# Altium footprint library con-amp.PCBLIB: 295 footprints (part 4 of 19)
Each footprint in its own frame and in the unit in brackets; x right, y up, seen from the top. Pads: shape width x height; smd on the part's side, far side on the other; paste and mask are expansions set on the pad; w line width, h text height; cw(c..) or ccw(c..) is an arc to the next point about the centre after c.
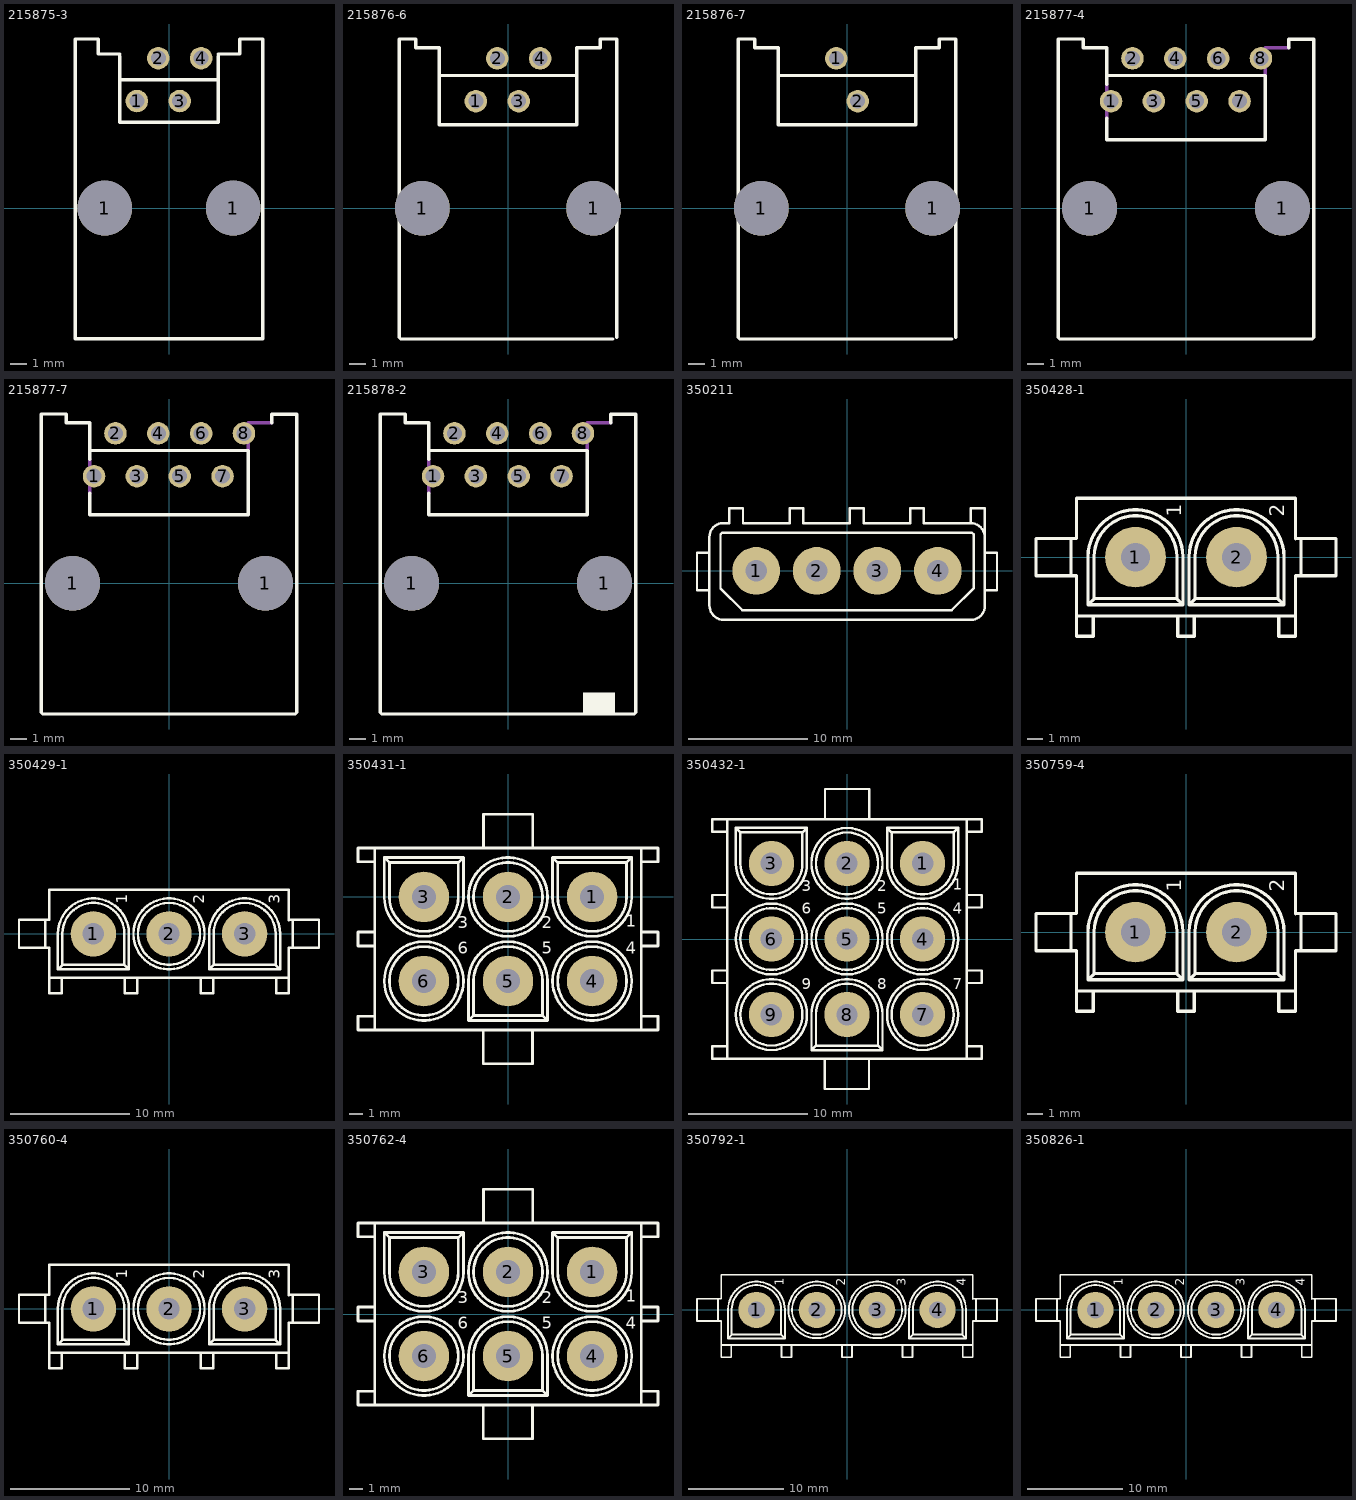
[diagram p3: the footprints below, top view; thin cyan lines are the x and y axes]

## 215875-3 [mil]
pads (6):
  round 128 hole 128: 1(-150,0) 1(150,0)
  round 52.5 hole 35: 1(-75,250) 2(-25,350) 3(25,250) 4(75,350)
Top Overlay:
  lines w8: -218.35,-305.51 -218.35,394.8 -165,394.8 -165,360 -115,359.8 ; -215,-305 215,-305 ; -115,355 -115,300 ; 115,355 115,300 ; 115,359.8 165,360 165,394.8 218.35,394.8 218.35,-305.51 ; -115,300 -115,200 115,200 115,300 ; -115,300 115,300

## 215876-6 [mil]
pads (6):
  round 128 hole 128: 1(-200,0) 1(200,0)
  round 52.5 hole 35: 1(-75,250) 2(-25,350) 3(25,250) 4(75,350)
Top Overlay:
  lines w8: -253.35,-300.51 -253.35,394.8 ; -253.35,395.2 -215,395.2 -215,375 -160,375.2 ; -250,-305 245,-305 ; -160,375 -160,310 ; 160,375 160,310 ; 160,375.2 215,375 215,395.2 253.35,395.2 ; 253.35,-300.51 253.35,394.8 ; -160,310 160,310 ; -160,310 -160,195 160,195 160,310

## 215876-7 [mil]
pads (4):
  round 128 hole 128: 1(-200,0) 1(200,0)
  round 52.5 hole 35: 1(-25,350) 2(25,250)
Top Overlay:
  lines w8: -253.35,-300.51 -253.35,394.8 ; -253.35,395.2 -215,395.2 -215,375 -160,375.2 ; -250,-305 245,-305 ; -160,375 -160,310 ; 160,375 160,310 ; 160,375.2 215,375 215,395.2 253.35,395.2 ; 253.35,-300.51 253.35,394.8 ; -160,310 160,310 ; -160,310 -160,195 160,195 160,310

## 215877-4 [mil]
pads (10):
  round 128 hole 128: 1(-225,0) 1(225,0)
  round 52.5 hole 35: 1(-175,250) 2(-125,350) 3(-75,250) 4(-25,350) 5(25,250) 6(75,350) 7(125,250) 8(175,350)
Top Overlay:
  lines w8: -298.35,-300.51 -298.35,394.8 ; -298.35,395.2 -240,395.2 -240,375 -185,375.2 ; -295,-305 295,-305 ; -185,210 -185,160 185,160 185,310 -185,310 ; -185,290 -185,310 ; -185,375 -185,310 ; 240,375 240,394.8 ; 240,395.2 240,394.8 ; 298.35,-300.51 298.35,394.8 240,394.8
Mechanical 16:
  lines w8: -185,210 -185,290 ; 185,310 185,374.8 240,375

## 215877-7 [mil]
pads (10):
  round 128 hole 128: 1(-225,0) 1(225,0)
  round 52.5 hole 35: 1(-175,250) 2(-125,350) 3(-75,250) 4(-25,350) 5(25,250) 6(75,350) 7(125,250) 8(175,350)
Top Overlay:
  lines w8: -298.35,-300.51 -298.35,394.8 ; -298.35,395.2 -240,395.2 -240,375 -185,375.2 ; -295,-305 295,-305 ; -185,210 -185,160 185,160 185,310 -185,310 ; -185,290 -185,310 ; -185,375 -185,310 ; 240,375 240,394.8 ; 240,395.2 240,394.8 ; 298.35,-300.51 298.35,394.8 240,394.8
Mechanical 16:
  lines w8: -185,210 -185,290 ; 185,310 185,374.8 240,375

## 215878-2 [mil]
pads (10):
  round 128 hole 128: 1(-225,0) 1(225,0)
  round 52.5 hole 35: 1(-175,250) 2(-125,350) 3(-75,250) 4(-25,350) 5(25,250) 6(75,350) 7(125,250) 8(175,350)
Top Overlay:
  rectangle: 175,-305 250,-255
  lines w8: -298.35,-300.51 -298.35,394.8 ; -298.35,395.2 -240,395.2 -240,375 -185,375.2 ; -295,-305 295,-305 ; -185,210 -185,160 185,160 185,310 -185,310 ; -185,290 -185,310 ; -185,375 -185,310 ; 240,375 240,394.8 ; 240,395.2 240,394.8 ; 298.35,-300.51 298.35,394.8 240,394.8
Mechanical 16:
  lines w8: -185,210 -185,290 ; 185,310 185,374.8 240,375

## 350211 [mm]
pads (4):
  round 4 hole 1.8: 1(-7.62,0) 2(-2.54,0) 3(2.54,0) 4(7.62,0)
Top Overlay:
  lines w0.203: 11.578,2.841 11.578,5.25 ; 11.578,5.255 10.374,5.255 10.374,3.996 ; -11.551,-1.642 -11.551,1.533 ; -11.551,-1.642 -11.551,-2.901 ccw(c-10.346,-2.901) -10.346,-4.106 10.401,-4.106 ccw(c10.401,-2.929) 11.578,-2.929 11.578,-1.642 ; -11.551,-1.642 -12.591,-1.642 -12.591,1.533 -11.551,1.533 ; -11.551,1.533 -11.551,2.847 cw(c-10.401,2.847) -10.401,3.996 -9.881,3.996 -9.881,5.255 -8.732,5.255 -8.732,3.996 -4.817,3.996 -4.817,5.255 -3.668,5.255 -3.668,3.996 0.246,3.996 0.246,5.255 1.396,5.255 1.396,3.996 5.31,3.996 5.31,5.255 6.459,5.255 6.459,3.996 10.374,3.996 ; 10.374,3.996 cw(c10.374,2.792) 11.578,2.792 11.578,1.533 ; 11.578,-1.642 12.591,-1.642 12.591,1.533 11.578,1.533 ; 11.578,-1.642 11.578,1.533 ; -10.62,-1.478 -8.786,-3.312 8.786,-3.312 10.647,-1.451 10.647,3.038 10.483,3.202 -10.483,3.202 -10.62,3.066 -10.62,-1.478
Mechanical 16:
  circle w0.203: c7.62,0 r1.651
  circle w0.203: c2.54,0 r1.651
  circle w0.203: c-2.54,0 r1.651
  circle w0.203: c-7.62,0 r1.651

## 350428-1 [mil]
pads (2):
  round 150 hole 70.87: 1(-125,0) 2(125,0)
Top Overlay:
  lines w8: -285.43,-46.26 -371.06,-46.26 -371.06,46.26 -285.43,46.26 ; -270.67,-146.65 -270.67,-195.87 -229.33,-195.87 -229.33,-149.61 ; -242.49,0 -242.49,-117.5 ; -242.5,2.5 cw(c-125,-0.21) -7.51,2.5 -7.51,0 ; -227.49,0 -227.49,-102.5 ; -227.5,2.5 cw(c-125,-0.1) -22.51,2.5 -22.51,0 -22.49,-102.5 ; -20.67,-148.62 -20.67,-195.87 20.67,-195.87 20.67,-148.62 ; 227.5,0 227.5,-102.5 ; 227.49,2.5 ccw(c124.99,-0.17) 22.49,2.5 22.49,0 22.51,-102.5 ; 229.33,-150.59 229.33,-195.87 270.67,-195.87 270.67,-147.64 ; 242.5,0 242.5,-117.5 ; 242.49,2.5 ccw(c124.99,-0.21) 7.49,2.5 7.49,0 7.51,-117.5 ; 270.67,45.28 270.67,46.26 ; 285.43,-46.26 371.06,-46.26 371.06,46.26 285.43,46.26 ; -242.49,-117.5 -227.49,-102.5 ; -242.49,-117.5 -7.49,-117.5 ; -227.49,-102.5 -22.49,-102.5 ; -22.49,-102.5 -7.49,-117.5 ; -7.49,-117.5 -7.49,0 ; -7.49,0 -7.51,0 ; 7.51,-117.5 242.5,-117.5 ; 7.51,-117.5 22.51,-102.5 ; 22.51,-102.5 227.5,-102.5 ; 227.5,-102.5 242.5,-117.5 ; 270.67,46.26 270.67,145.67 -270.67,145.67 -270.67,46.26 -284.45,46.26 -284.45,-46.26 -270.67,-46.26 -270.67,-145.67 270.67,-145.67 270.67,-46.26 284.45,-46.26 284.45,46.26 270.67,46.26
  text "1" at 0,100 h62
  text "2" at 255,100 h62
Mechanical 16:
  circle w8: c125,0 r62.5
  circle w8: c-125,0 r62.51

## 350429-1 [mil]
pads (3):
  round 150 hole 70.87: 1(-250,0) 2(0,0) 3(250,0)
Top Overlay:
  lines w8: -410.43,-46.26 -496.06,-46.26 -496.06,46.26 -410.43,46.26 ; -395.67,-146.65 -395.67,-195.87 -354.33,-195.87 -354.33,-149.61 ; -367.49,0 -367.49,-117.5 ; -367.5,2.5 cw(c-250,-0.21) -132.51,2.5 -132.51,0 ; -352.49,0 -352.49,-102.5 ; -352.5,2.5 cw(c-250,-0.1) -147.51,2.5 -147.51,0 -147.49,-102.5 ; -145.67,-148.62 -145.67,-195.87 -104.33,-195.87 -104.33,-148.62 ; -117.49,-2.5 ccw(c0.01,0.21) 117.51,-2.5 ; -117.51,2.5 cw(c-0.01,-0.21) 117.49,2.5 ; -102.49,-2.5 ccw(c0.01,0.17) 102.51,-2.5 ; -102.51,2.5 cw(c-0.01,-0.17) 102.49,2.5 ; 104.33,-148.62 104.33,-195.87 145.67,-195.87 145.67,-148.62 ; 352.5,0 352.5,-102.5 ; 352.49,2.5 ccw(c249.99,-0.17) 147.49,2.5 147.49,0 147.51,-102.5 ; 354.33,-150.59 354.33,-195.87 395.67,-195.87 395.67,-147.64 ; 367.5,0 367.5,-117.5 ; 367.49,2.5 ccw(c249.99,-0.21) 132.49,2.5 132.49,0 132.51,-117.5 ; 395.67,45.28 395.67,46.26 ; 410.43,-46.26 496.06,-46.26 496.06,46.26 410.43,46.26 ; -367.49,-117.5 -352.49,-102.5 ; -367.49,-117.5 -132.49,-117.5 ; -352.49,-102.5 -147.49,-102.5 ; -147.49,-102.5 -132.49,-117.5 ; -132.49,-117.5 -132.49,0 ; -132.49,0 -132.51,0 ; 132.51,-117.5 367.5,-117.5 ; 132.51,-117.5 147.51,-102.5 ; 147.51,-102.5 352.5,-102.5 ; 352.5,-102.5 367.5,-117.5 ; 395.67,46.26 395.67,145.67 -395.67,145.67 -395.67,46.26 -409.45,46.26 -409.45,-46.26 -395.67,-46.26 -395.67,-145.67 395.67,-145.67 395.67,-46.26 409.45,-46.26 409.45,46.26 395.67,46.26
  text "1" at -125,100 h62
  text "2" at 130,100 h62
  text "3" at 380,100 h62
Mechanical 16:
  circle w8: c250,0 r62.5
  circle w8: c-250,0 r62.51
  circle w8: c0,0 r62.5

## 350431-1 [mil]
pads (6):
  round 150 hole 70.87: 1(250,0) 2(0,0) 3(-250,0) 4(250,-250) 5(0,-250) 6(-250,-250)
Top Overlay:
  circle w0.04: c0,0 r102.5
  circle w0.04: c250,0 r43.25
  circle w0.04: c0,0 r43.25
  circle w0.04: c-250,0 r43.25
  circle w0.04: c250,-250 r102.5
  circle w0.04: c250,-250 r43.25
  circle w0.04: c0,-250 r43.25
  circle w0.04: c-250,-250 r102.5
  circle w0.04: c-250,-250 r43.25
  lines w8: -398.62,-395.67 -445.87,-395.67 -445.87,-354.33 -397.64,-354.33 ; -398.62,-145.67 -445.87,-145.67 -445.87,-104.33 -397.64,-104.33 ; -398.62,104.33 -445.87,104.33 -445.87,145.67 -397.64,145.67 ; -367.49,-252.5 ccw(c-249.99,-249.79) -132.49,-252.5 ; -367.51,-247.5 cw(c-250.01,-250.21) -132.51,-247.5 ; -367.49,-2.5 ccw(c-249.99,0.21) -132.49,-2.5 -132.49,0 -132.51,117.5 ; -367.5,0 -367.5,117.5 ; -352.49,-252.5 ccw(c-249.99,-249.83) -147.49,-252.5 ; -352.51,-247.5 cw(c-250.01,-250.17) -147.51,-247.5 ; -352.49,-2.5 ccw(c-249.99,0.17) -147.49,-2.5 -147.49,0 -147.51,102.5 ; -352.5,0 -352.5,102.5 ; -117.49,-2.5 ccw(c0.01,0.21) 117.51,-2.5 ; -117.51,2.5 cw(c-0.01,-0.21) 117.49,2.5 ; -102.49,-2.5 ccw(c0.01,0.17) 102.51,-2.5 ; -102.51,2.5 cw(c-0.01,-0.17) 102.49,2.5 ; -73.82,-399.8 -73.82,-496.26 72.83,-496.26 72.83,-400.79 ; -72.83,150.79 -72.83,246.26 73.82,246.26 73.82,149.8 ; 102.5,-250 102.5,-352.5 ; 102.49,-247.5 ccw(c-0.01,-250.17) -102.51,-247.5 -102.51,-250 -102.49,-352.5 ; 117.5,-250 117.5,-367.5 ; 117.49,-247.5 ccw(c-0.01,-250.21) -117.51,-247.5 -117.51,-250 -117.49,-367.5 ; 132.51,-252.5 ccw(c250.01,-249.79) 367.51,-252.5 ; 132.49,-247.5 cw(c249.99,-250.21) 367.49,-247.5 ; 147.51,-252.5 ccw(c250.01,-249.83) 352.51,-252.5 ; 147.49,-247.5 cw(c249.99,-250.17) 352.49,-247.5 ; 352.5,-2.5 cw(c250,0.1) 147.51,-2.5 147.51,0 147.49,102.5 ; 352.49,0 352.49,102.5 ; 367.5,-2.5 cw(c250,0.21) 132.51,-2.5 132.51,0 ; 367.49,0 367.49,117.5 ; 397.64,-395.67 445.87,-395.67 445.87,-354.33 398.62,-354.33 ; 397.64,-145.67 445.87,-145.67 445.87,-104.33 398.62,-104.33 ; 397.64,104.33 445.87,104.33 445.87,145.67 398.62,145.67 ; -367.5,117.5 -132.51,117.5 ; -367.5,117.5 -352.5,102.5 ; -352.5,102.5 -147.51,102.5 ; -147.51,102.5 -132.51,117.5 ; -117.49,-367.5 117.5,-367.5 ; -117.49,-367.5 -102.49,-352.5 ; -102.49,-352.5 102.5,-352.5 ; 102.5,-352.5 117.5,-367.5 ; 132.49,0 132.49,117.5 ; 132.49,0 132.51,0 ; 132.49,117.5 367.49,117.5 ; 132.49,117.5 147.49,102.5 ; 147.49,102.5 352.49,102.5 ; 352.49,102.5 367.49,117.5 ; -395.67,-395.67 395.67,-395.67 395.67,145.67 -395.67,145.67 -395.67,-395.67
  text "1" at 350,-100 h62
  text "2" at 100,-105 h62
  text "3" at -150,-105 h62
  text "4" at 350,-180 h62
  text "5" at 100,-180 h62
  text "6" at -150,-180 h62
Mechanical 16:
  circle w8: c-250,0 r62.5
  circle w8: c250,0 r62.51
  circle w8: c0,0 r62.5
  circle w8: c250,-250 r62.5
  circle w8: c0,-250 r62.5
  circle w8: c-250,-250 r62.5

## 350432-1 [mil]
pads (9):
  round 150 hole 70.87: 1(250,250) 2(0,250) 3(-250,250) 4(250,0) 5(0,0) 6(-250,0) 7(250,-250) 8(0,-250) 9(-250,-250)
Top Overlay:
  circle w0.04: c0,250 r102.5
  circle w0.04: c250,-250 r102.5
  circle w0.04: c-250,-250 r102.5
  circle w0.04: c250,0 r102.5
  circle w0.04: c0,0 r102.5
  circle w0.04: c-250,0 r102.5
  lines w8: -398.62,-395.67 -445.87,-395.67 -445.87,-354.33 -397.64,-354.33 ; -398.62,-145.67 -445.87,-145.67 -445.87,-104.33 -397.64,-104.33 ; -398.62,104.33 -445.87,104.33 -445.87,145.67 -397.64,145.67 ; -398.62,354.33 -445.87,354.33 -445.87,395.67 -397.64,395.67 ; -367.49,-252.5 ccw(c-249.99,-249.79) -132.49,-252.5 ; -367.51,-247.5 cw(c-250.01,-250.21) -132.51,-247.5 ; -367.49,-2.5 ccw(c-249.99,0.21) -132.49,-2.5 ; -367.51,2.5 cw(c-250.01,-0.21) -132.51,2.5 ; -367.49,247.5 ccw(c-249.99,250.21) -132.49,247.5 -132.49,250 -132.51,367.5 ; -367.5,250 -367.5,367.5 ; -352.49,-252.5 ccw(c-249.99,-249.83) -147.49,-252.5 ; -352.51,-247.5 cw(c-250.01,-250.17) -147.51,-247.5 ; -352.49,-2.5 ccw(c-249.99,0.17) -147.49,-2.5 ; -352.51,2.5 cw(c-250.01,-0.17) -147.51,2.5 ; -352.49,247.5 ccw(c-249.99,250.17) -147.49,247.5 -147.49,250 -147.51,352.5 ; -352.5,250 -352.5,352.5 ; -117.49,-2.5 ccw(c0.01,0.21) 117.51,-2.5 ; -117.51,2.5 cw(c-0.01,-0.21) 117.49,2.5 ; -117.49,247.5 ccw(c0.01,250.21) 117.51,247.5 ; -117.51,252.5 cw(c-0.01,249.79) 117.49,252.5 ; -102.49,-2.5 ccw(c0.01,0.17) 102.51,-2.5 ; -102.51,2.5 cw(c-0.01,-0.17) 102.49,2.5 ; -102.49,247.5 ccw(c0.01,250.17) 102.51,247.5 ; -102.51,252.5 cw(c-0.01,249.83) 102.49,252.5 ; -73.82,-399.8 -73.82,-496.26 72.83,-496.26 72.83,-400.79 ; -72.83,400.79 -72.83,496.26 73.82,496.26 73.82,399.8 ; 102.5,-250 102.5,-352.5 ; 102.49,-247.5 ccw(c-0.01,-250.17) -102.51,-247.5 -102.51,-250 -102.49,-352.5 ; 117.5,-250 117.5,-367.5 ; 117.49,-247.5 ccw(c-0.01,-250.21) -117.51,-247.5 -117.51,-250 -117.49,-367.5 ; 132.51,-252.5 ccw(c250.01,-249.79) 367.51,-252.5 ; 132.49,-247.5 cw(c249.99,-250.21) 367.49,-247.5 ; 132.51,-2.5 ccw(c250.01,0.21) 367.51,-2.5 ; 132.49,2.5 cw(c249.99,-0.21) 367.49,2.5 ; 147.51,-252.5 ccw(c250.01,-249.83) 352.51,-252.5 ; 147.49,-247.5 cw(c249.99,-250.17) 352.49,-247.5 ; 147.51,-2.5 ccw(c250.01,0.17) 352.51,-2.5 ; 147.49,2.5 cw(c249.99,-0.17) 352.49,2.5 ; 352.5,247.5 cw(c250,250.1) 147.51,247.5 147.51,250 147.49,352.5 ; 352.49,250 352.49,352.5 ; 367.5,247.5 cw(c250,250.21) 132.51,247.5 132.51,250 ; 367.49,250 367.49,367.5 ; 397.64,-395.67 445.87,-395.67 445.87,-354.33 398.62,-354.33 ; 397.64,-145.67 445.87,-145.67 445.87,-104.33 398.62,-104.33 ; 397.64,104.33 445.87,104.33 445.87,145.67 398.62,145.67 ; 397.64,354.33 445.87,354.33 445.87,395.67 398.62,395.67 ; -367.5,367.5 -132.51,367.5 ; -367.5,367.5 -352.5,352.5 ; -352.5,352.5 -147.51,352.5 ; -147.51,352.5 -132.51,367.5 ; -117.49,-367.5 117.5,-367.5 ; -117.49,-367.5 -102.49,-352.5 ; -102.49,-352.5 102.5,-352.5 ; 102.5,-352.5 117.5,-367.5 ; 132.49,250 132.49,367.5 ; 132.49,250 132.51,250 ; 132.49,367.5 367.49,367.5 ; 132.49,367.5 147.49,352.5 ; 147.49,352.5 352.49,352.5 ; 352.49,352.5 367.49,367.5 ; -395.67,-395.67 395.67,-395.67 395.67,395.67 -395.67,395.67 -395.67,-395.67
  text "1" at 350,150 h62
  text "2" at 100,145 h62
  text "3" at -150,145 h62
  text "7" at 350,-180 h62
  text "8" at 100,-180 h62
  text "9" at -150,-180 h62
  text "4" at 350,70 h62
  text "5" at 100,70 h62
  text "6" at -150,70 h62
Mechanical 16:
  circle w8: c-250,250 r62.5
  circle w8: c250,250 r62.51
  circle w8: c0,250 r62.5
  circle w8: c250,-250 r62.5
  circle w8: c0,-250 r62.5
  circle w8: c-250,-250 r62.5
  circle w8: c250,0 r62.5
  circle w8: c0,0 r62.5
  circle w8: c-250,0 r62.5

## 350759-4 [mil]
pads (2):
  round 150 hole 70.87: 1(-125,0) 2(125,0)
Top Overlay:
  lines w8: -285.43,-46.26 -371.06,-46.26 -371.06,46.26 -285.43,46.26 ; -270.67,-146.65 -270.67,-195.87 -229.33,-195.87 -229.33,-149.61 ; -242.49,0 -242.49,-117.5 ; -242.5,2.5 cw(c-125,-0.21) -7.51,2.5 -7.51,0 ; -227.49,0 -227.49,-102.5 ; -227.5,2.5 cw(c-125,-0.1) -22.51,2.5 -22.51,0 -22.49,-102.5 ; -20.67,-148.62 -20.67,-195.87 20.67,-195.87 20.67,-148.62 ; 227.5,0 227.5,-102.5 ; 227.49,2.5 ccw(c124.99,-0.17) 22.49,2.5 22.49,0 22.51,-102.5 ; 229.33,-150.59 229.33,-195.87 270.67,-195.87 270.67,-147.64 ; 242.5,0 242.5,-117.5 ; 242.49,2.5 ccw(c124.99,-0.21) 7.49,2.5 7.49,0 7.51,-117.5 ; 270.67,45.28 270.67,46.26 ; 285.43,-46.26 371.06,-46.26 371.06,46.26 285.43,46.26 ; -242.49,-117.5 -227.49,-102.5 ; -242.49,-117.5 -7.49,-117.5 ; -227.49,-102.5 -22.49,-102.5 ; -22.49,-102.5 -7.49,-117.5 ; -7.49,-117.5 -7.49,0 ; -7.49,0 -7.51,0 ; 7.51,-117.5 242.5,-117.5 ; 7.51,-117.5 22.51,-102.5 ; 22.51,-102.5 227.5,-102.5 ; 227.5,-102.5 242.5,-117.5 ; 270.67,46.26 270.67,145.67 -270.67,145.67 -270.67,46.26 -284.45,46.26 -284.45,-46.26 -270.67,-46.26 -270.67,-145.67 270.67,-145.67 270.67,-46.26 284.45,-46.26 284.45,46.26 270.67,46.26
  text "1" at 0,100 h62
  text "2" at 255,100 h62
Mechanical 16:
  circle w8: c125,0 r62.5
  circle w8: c-125,0 r62.51

## 350760-4 [mil]
pads (3):
  round 150 hole 70.87: 1(-250,0) 2(0,0) 3(250,0)
Top Overlay:
  lines w8: -410.43,-46.26 -496.06,-46.26 -496.06,46.26 -410.43,46.26 ; -395.67,-146.65 -395.67,-195.87 -354.33,-195.87 -354.33,-149.61 ; -367.49,0 -367.49,-117.5 ; -367.5,2.5 cw(c-250,-0.21) -132.51,2.5 -132.51,0 ; -352.49,0 -352.49,-102.5 ; -352.5,2.5 cw(c-250,-0.1) -147.51,2.5 -147.51,0 -147.49,-102.5 ; -145.67,-148.62 -145.67,-195.87 -104.33,-195.87 -104.33,-148.62 ; -117.49,-2.5 ccw(c0.01,0.21) 117.51,-2.5 ; -117.51,2.5 cw(c-0.01,-0.21) 117.49,2.5 ; -102.49,-2.5 ccw(c0.01,0.17) 102.51,-2.5 ; -102.51,2.5 cw(c-0.01,-0.17) 102.49,2.5 ; 104.33,-148.62 104.33,-195.87 145.67,-195.87 145.67,-148.62 ; 352.5,0 352.5,-102.5 ; 352.49,2.5 ccw(c249.99,-0.17) 147.49,2.5 147.49,0 147.51,-102.5 ; 354.33,-150.59 354.33,-195.87 395.67,-195.87 395.67,-147.64 ; 367.5,0 367.5,-117.5 ; 367.49,2.5 ccw(c249.99,-0.21) 132.49,2.5 132.49,0 132.51,-117.5 ; 395.67,45.28 395.67,46.26 ; 410.43,-46.26 496.06,-46.26 496.06,46.26 410.43,46.26 ; -367.49,-117.5 -352.49,-102.5 ; -367.49,-117.5 -132.49,-117.5 ; -352.49,-102.5 -147.49,-102.5 ; -147.49,-102.5 -132.49,-117.5 ; -132.49,-117.5 -132.49,0 ; -132.49,0 -132.51,0 ; 132.51,-117.5 367.5,-117.5 ; 132.51,-117.5 147.51,-102.5 ; 147.51,-102.5 352.5,-102.5 ; 352.5,-102.5 367.5,-117.5 ; 395.67,46.26 395.67,145.67 -395.67,145.67 -395.67,46.26 -409.45,46.26 -409.45,-46.26 -395.67,-46.26 -395.67,-145.67 395.67,-145.67 395.67,-46.26 409.45,-46.26 409.45,46.26 395.67,46.26
  text "1" at -125,100 h62
  text "2" at 130,100 h62
  text "3" at 380,100 h62
Mechanical 16:
  circle w8: c250,0 r62.5
  circle w8: c-250,0 r62.51
  circle w8: c0,0 r62.5

## 350762-4 [mil]
pads (6):
  round 150 hole 70.87: 1(250,125) 2(0,125) 3(-250,125) 4(250,-125) 5(0,-125) 6(-250,-125)
Top Overlay:
  circle w0.04: c0,125 r102.5
  circle w0.04: c250,125 r43.25
  circle w0.04: c0,125 r43.25
  circle w0.04: c-250,125 r43.25
  circle w0.04: c250,-125 r102.5
  circle w0.04: c250,-125 r43.25
  circle w0.04: c0,-125 r43.25
  circle w0.04: c-250,-125 r102.5
  circle w0.04: c-250,-125 r43.25
  lines w8: -398.62,-270.67 -445.87,-270.67 -445.87,-229.33 -397.64,-229.33 ; -398.62,-20.67 -445.87,-20.67 -445.87,20.67 -397.64,20.67 ; -398.62,229.33 -445.87,229.33 -445.87,270.67 -397.64,270.67 ; -367.49,-127.5 ccw(c-249.99,-124.79) -132.49,-127.5 ; -367.51,-122.5 cw(c-250.01,-125.21) -132.51,-122.5 ; -367.49,122.5 ccw(c-249.99,125.21) -132.49,122.5 -132.49,125 -132.51,242.5 ; -367.5,125 -367.5,242.5 ; -352.49,-127.5 ccw(c-249.99,-124.83) -147.49,-127.5 ; -352.51,-122.5 cw(c-250.01,-125.17) -147.51,-122.5 ; -352.49,122.5 ccw(c-249.99,125.17) -147.49,122.5 -147.49,125 -147.51,227.5 ; -352.5,125 -352.5,227.5 ; -117.49,122.5 ccw(c0.01,125.21) 117.51,122.5 ; -117.51,127.5 cw(c-0.01,124.79) 117.49,127.5 ; -102.49,122.5 ccw(c0.01,125.17) 102.51,122.5 ; -102.51,127.5 cw(c-0.01,124.83) 102.49,127.5 ; -73.82,-274.8 -73.82,-371.26 72.83,-371.26 72.83,-275.79 ; -72.83,275.79 -72.83,371.26 73.82,371.26 73.82,274.8 ; 102.5,-125 102.5,-227.5 ; 102.49,-122.5 ccw(c-0.01,-125.17) -102.51,-122.5 -102.51,-125 -102.49,-227.5 ; 117.5,-125 117.5,-242.5 ; 117.49,-122.5 ccw(c-0.01,-125.21) -117.51,-122.5 -117.51,-125 -117.49,-242.5 ; 132.51,-127.5 ccw(c250.01,-124.79) 367.51,-127.5 ; 132.49,-122.5 cw(c249.99,-125.21) 367.49,-122.5 ; 147.51,-127.5 ccw(c250.01,-124.83) 352.51,-127.5 ; 147.49,-122.5 cw(c249.99,-125.17) 352.49,-122.5 ; 352.5,122.5 cw(c250,125.1) 147.51,122.5 147.51,125 147.49,227.5 ; 352.49,125 352.49,227.5 ; 367.5,122.5 cw(c250,125.21) 132.51,122.5 132.51,125 ; 367.49,125 367.49,242.5 ; 397.64,-270.67 445.87,-270.67 445.87,-229.33 398.62,-229.33 ; 397.64,-20.67 445.87,-20.67 445.87,20.67 398.62,20.67 ; 397.64,229.33 445.87,229.33 445.87,270.67 398.62,270.67 ; -367.5,242.5 -132.51,242.5 ; -367.5,242.5 -352.5,227.5 ; -352.5,227.5 -147.51,227.5 ; -147.51,227.5 -132.51,242.5 ; -117.49,-242.5 117.5,-242.5 ; -117.49,-242.5 -102.49,-227.5 ; -102.49,-227.5 102.5,-227.5 ; 102.5,-227.5 117.5,-242.5 ; 132.49,125 132.49,242.5 ; 132.49,125 132.51,125 ; 132.49,242.5 367.49,242.5 ; 132.49,242.5 147.49,227.5 ; 147.49,227.5 352.49,227.5 ; 352.49,227.5 367.49,242.5 ; -395.67,-270.67 395.67,-270.67 395.67,270.67 -395.67,270.67 -395.67,-270.67
  text "1" at 350,25 h62
  text "2" at 100,20 h62
  text "3" at -150,20 h62
  text "4" at 350,-55 h62
  text "5" at 100,-55 h62
  text "6" at -150,-55 h62
Mechanical 16:
  circle w8: c-250,125 r62.5
  circle w8: c250,125 r62.51
  circle w8: c0,125 r62.5
  circle w8: c250,-125 r62.5
  circle w8: c0,-125 r62.5
  circle w8: c-250,-125 r62.5

## 350792-1 [mil]
pads (4):
  round 150 hole 70.87: 1(-375,0) 2(-125,0) 3(125,0) 4(375,0)
Top Overlay:
  lines w8: -535.43,-46.26 -621.06,-46.26 -621.06,46.26 -535.43,46.26 ; -520.67,-146.65 -520.67,-195.87 -479.33,-195.87 -479.33,-149.61 ; -492.49,0 -492.49,-117.5 ; -492.5,2.5 cw(c-375,-0.21) -257.51,2.5 -257.51,0 ; -477.49,0 -477.49,-102.5 ; -477.5,2.5 cw(c-375,-0.1) -272.51,2.5 -272.51,0 -272.49,-102.5 ; -270.67,-148.62 -270.67,-195.87 -229.33,-195.87 -229.33,-148.62 ; -242.49,-2.5 ccw(c-124.99,0.21) -7.49,-2.5 ; -242.51,2.5 cw(c-125.01,-0.21) -7.51,2.5 ; -227.49,-2.5 ccw(c-124.99,0.17) -22.49,-2.5 ; -227.51,2.5 cw(c-125.01,-0.17) -22.51,2.5 ; -20.67,-148.62 -20.67,-195.87 20.67,-195.87 20.67,-148.62 ; 7.51,-2.5 ccw(c125.01,0.21) 242.51,-2.5 ; 7.49,2.5 cw(c124.99,-0.21) 242.49,2.5 ; 22.51,-2.5 ccw(c125.01,0.17) 227.51,-2.5 ; 22.49,2.5 cw(c124.99,-0.17) 227.49,2.5 ; 229.33,-148.62 229.33,-195.87 270.67,-195.87 270.67,-148.62 ; 477.5,0 477.5,-102.5 ; 477.49,2.5 ccw(c374.99,-0.17) 272.49,2.5 272.49,0 272.51,-102.5 ; 479.33,-150.59 479.33,-195.87 520.67,-195.87 520.67,-147.64 ; 492.5,0 492.5,-117.5 ; 492.49,2.5 ccw(c374.99,-0.21) 257.49,2.5 257.49,0 257.51,-117.5 ; 520.67,45.28 520.67,46.26 ; 535.43,-46.26 621.06,-46.26 621.06,46.26 535.43,46.26 ; -492.49,-117.5 -477.49,-102.5 ; -492.49,-117.5 -257.49,-117.5 ; -477.49,-102.5 -272.49,-102.5 ; -272.49,-102.5 -257.49,-117.5 ; -257.49,-117.5 -257.49,0 ; -257.49,0 -257.51,0 ; 257.51,-117.5 492.5,-117.5 ; 257.51,-117.5 272.51,-102.5 ; 272.51,-102.5 477.5,-102.5 ; 477.5,-102.5 492.5,-117.5 ; 520.67,46.26 520.67,145.67 -520.67,145.67 -520.67,46.26 -534.45,46.26 -534.45,-46.26 -520.67,-46.26 -520.67,-145.67 520.67,-145.67 520.67,-46.26 534.45,-46.26 534.45,46.26 520.67,46.26
  text "1" at -250,100 h62
  text "2" at 5,100 h62
  text "3" at 255,100 h62
  text "4" at 505,100 h62
Mechanical 16:
  circle w8: c375,0 r62.5
  circle w8: c-375,0 r62.51
  circle w8: c-125,0 r62.5
  circle w8: c125,0 r62.5

## 350826-1 [mil]
pads (4):
  round 150 hole 70.87: 1(-375,0) 2(-125,0) 3(125,0) 4(375,0)
Top Overlay:
  lines w8: -535.43,-46.26 -621.06,-46.26 -621.06,46.26 -535.43,46.26 ; -520.67,-146.65 -520.67,-195.87 -479.33,-195.87 -479.33,-149.61 ; -492.49,0 -492.49,-117.5 ; -492.5,2.5 cw(c-375,-0.21) -257.51,2.5 -257.51,0 ; -477.49,0 -477.49,-102.5 ; -477.5,2.5 cw(c-375,-0.1) -272.51,2.5 -272.51,0 -272.49,-102.5 ; -270.67,-148.62 -270.67,-195.87 -229.33,-195.87 -229.33,-148.62 ; -242.49,-2.5 ccw(c-124.99,0.21) -7.49,-2.5 ; -242.51,2.5 cw(c-125.01,-0.21) -7.51,2.5 ; -227.49,-2.5 ccw(c-124.99,0.17) -22.49,-2.5 ; -227.51,2.5 cw(c-125.01,-0.17) -22.51,2.5 ; -20.67,-148.62 -20.67,-195.87 20.67,-195.87 20.67,-148.62 ; 7.51,-2.5 ccw(c125.01,0.21) 242.51,-2.5 ; 7.49,2.5 cw(c124.99,-0.21) 242.49,2.5 ; 22.51,-2.5 ccw(c125.01,0.17) 227.51,-2.5 ; 22.49,2.5 cw(c124.99,-0.17) 227.49,2.5 ; 229.33,-148.62 229.33,-195.87 270.67,-195.87 270.67,-148.62 ; 477.5,0 477.5,-102.5 ; 477.49,2.5 ccw(c374.99,-0.17) 272.49,2.5 272.49,0 272.51,-102.5 ; 479.33,-150.59 479.33,-195.87 520.67,-195.87 520.67,-147.64 ; 492.5,0 492.5,-117.5 ; 492.49,2.5 ccw(c374.99,-0.21) 257.49,2.5 257.49,0 257.51,-117.5 ; 520.67,45.28 520.67,46.26 ; 535.43,-46.26 621.06,-46.26 621.06,46.26 535.43,46.26 ; -492.49,-117.5 -477.49,-102.5 ; -492.49,-117.5 -257.49,-117.5 ; -477.49,-102.5 -272.49,-102.5 ; -272.49,-102.5 -257.49,-117.5 ; -257.49,-117.5 -257.49,0 ; -257.49,0 -257.51,0 ; 257.51,-117.5 492.5,-117.5 ; 257.51,-117.5 272.51,-102.5 ; 272.51,-102.5 477.5,-102.5 ; 477.5,-102.5 492.5,-117.5 ; 520.67,46.26 520.67,145.67 -520.67,145.67 -520.67,46.26 -534.45,46.26 -534.45,-46.26 -520.67,-46.26 -520.67,-145.67 520.67,-145.67 520.67,-46.26 534.45,-46.26 534.45,46.26 520.67,46.26
  text "1" at -250,100 h62
  text "2" at 5,100 h62
  text "3" at 255,100 h62
  text "4" at 505,100 h62
Mechanical 16:
  circle w8: c375,0 r62.5
  circle w8: c-375,0 r62.51
  circle w8: c-125,0 r62.5
  circle w8: c125,0 r62.5